# Altium schematic symbol library jlcpcb_2025_04_capacitors_extended_0805.schlib: 3281 symbols (part 2 of 18) (continued)
## 0805B331K201CT
designator C?  Capacitance: 330pF  (hidden comment: *)
Capacitor, Ceramic (MLCC), 330pF, ±10%, 200V, X7R, ±10%, SMD 0805; Manufacturer: Walsin Tech Corp; Manufacturer Part Number: 0805B331K201CT; Package Size: 0805; JLCPCB Basic Part: No; JLCPCB Part Number: C77467; Supplier 1: LCSC; Category: Capacitors - MLCC; Supplier Part Number 1: C77467; Tolerance: ±10%; Voltage Rating: 200V; Temperature Coefficient: X7R; RoHS: Yes; ComponentLink1Description: Datasheet; ComponentLink1URL: https://wmsc.lcsc.com/wmsc/upload/file/pdf/v2/lcsc/2304140030_Walsin-Tech-Corp-0805B331K201CT_C77467.pdf; ComponentLink2Description: JLCPCB Part URL; ComponentLink2URL: https://jlcpcb.com/partdetail/C77467; ComponentLink3Description: LCSC Part URL; ComponentLink3URL: https://lcsc.com/product-detail/Multilayer-Ceramic-Capacitors-MLCC---SMD-SMT_Walsin-Tech-Corp-Walsin-Tech-Corp-0805B331K201CT_C77467.html
footprint CAP-0805 (0805 (2012M) Capacitor)
pins: 1, 2

## 0805B331K201NT
designator C?  Capacitance: 330pF  (hidden comment: *)
Capacitor, Ceramic (MLCC), 330pF, ±10%, 200V, X7R, ±10%, SMD 0805; Manufacturer: FH (Guangdong Fenghua Advanced Tech); Manufacturer Part Number: 0805B331K201NT; Package Size: 0805; JLCPCB Basic Part: No; JLCPCB Part Number: C2991516; Supplier 1: LCSC; Category: Capacitors - MLCC; Supplier Part Number 1: C2991516; Tolerance: ±10%; Voltage Rating: 200V; Temperature Coefficient: X7R; RoHS: Yes; ComponentLink1Description: Datasheet; ComponentLink1URL: https://wmsc.lcsc.com/wmsc/upload/file/pdf/v2/lcsc/2204111630_FH--Guangdong-Fenghua-Advanced-Tech-0805B331K201NT_C2991516.pdf; ComponentLink2Description: JLCPCB Part URL; ComponentLink2URL: https://jlcpcb.com/partdetail/C2991516; ComponentLink3Description: LCSC Part URL; ComponentLink3URL: https://lcsc.com/product-detail/Multilayer-Ceramic-Capacitors-MLCC---SMD-SMT_FH-Guangdong-Fenghua-Advanced-Tech-FH-Guangdong-Fenghua-Advanced-Tech-0805B331K201NT_C2991516.html
footprint CAP-0805 (0805 (2012M) Capacitor)
pins: 1, 2

## 0805B331K251CT
designator C?  Capacitance: 330pF  (hidden comment: *)
Capacitor, Ceramic (MLCC), 330pF, ±10%, 250V, X7R, ±10%, SMD 0805; Manufacturer: Walsin Tech Corp; Manufacturer Part Number: 0805B331K251CT; Package Size: 0805; JLCPCB Basic Part: No; JLCPCB Part Number: C152985; Supplier 1: LCSC; Category: Capacitors - MLCC; Supplier Part Number 1: C152985; Tolerance: ±10%; Voltage Rating: 250V; Temperature Coefficient: X7R; RoHS: Yes; ComponentLink1Description: Datasheet; ComponentLink1URL: https://wmsc.lcsc.com/wmsc/upload/file/pdf/v2/lcsc/2304140030_Walsin-Tech-Corp-0805B331K251CT_C152985.pdf; ComponentLink2Description: JLCPCB Part URL; ComponentLink2URL: https://jlcpcb.com/partdetail/C152985; ComponentLink3Description: LCSC Part URL; ComponentLink3URL: https://lcsc.com/product-detail/Multilayer-Ceramic-Capacitors-MLCC---SMD-SMT_Walsin-Tech-Corp-Walsin-Tech-Corp-0805B331K251CT_C152985.html
footprint CAP-0805 (0805 (2012M) Capacitor)
pins: 1, 2

## 0805B331K251NT
designator C?  Capacitance: 330pF  (hidden comment: *)
Capacitor, Ceramic (MLCC), 330pF, 250V, X7R, SMD 0805; Manufacturer: FH-BK(Guangdong Fenghua Bangke Elec); Manufacturer Part Number: 0805B331K251NT; Package Size: 0805; JLCPCB Basic Part: No; JLCPCB Part Number: C2961013; Supplier 1: LCSC; Category: Capacitors - MLCC; Supplier Part Number 1: C2961013; Voltage Rating: 250V; Temperature Coefficient: X7R; RoHS: Yes; ComponentLink1Description: Datasheet; ComponentLink1URL: https://wmsc.lcsc.com/wmsc/upload/file/pdf/v2/lcsc/2201191030_FH-BK-Guangdong-Fenghua-Bangke-Elec-0805B331K251NT_C2961013.pdf; ComponentLink2Description: JLCPCB Part URL; ComponentLink2URL: https://jlcpcb.com/partdetail/C2961013; ComponentLink3Description: LCSC Part URL; ComponentLink3URL: https://lcsc.com/product-detail/Multilayer-Ceramic-Capacitors-MLCC---SMD-SMT_FH-BKGuangdong-Fenghua-Bangke-Elec-FH-BKGuangdong-Fenghua-Bangke-Elec-0805B331K251NT_C2961013.html
footprint CAP-0805 (0805 (2012M) Capacitor)
pins: 1, 2

## 0805B331K500CT
designator C?  Capacitance: 330pF  (hidden comment: *)
Capacitor, Ceramic (MLCC), 330pF, ±10%, 50V, X7R, ±10%, SMD 0805; Manufacturer: Walsin Tech Corp; Manufacturer Part Number: 0805B331K500CT; Package Size: 0805; JLCPCB Basic Part: No; JLCPCB Part Number: C123618; Supplier 1: LCSC; Category: Capacitors - MLCC; Supplier Part Number 1: C123618; Tolerance: ±10%; Voltage Rating: 50V; Temperature Coefficient: X7R; RoHS: Yes; ComponentLink1Description: Datasheet; ComponentLink1URL: https://wmsc.lcsc.com/wmsc/upload/file/pdf/v2/lcsc/2304140030_Walsin-Tech-Corp-0805B331K500CT_C123618.pdf; ComponentLink2Description: JLCPCB Part URL; ComponentLink2URL: https://jlcpcb.com/partdetail/C123618; ComponentLink3Description: LCSC Part URL; ComponentLink3URL: https://lcsc.com/product-detail/Multilayer-Ceramic-Capacitors-MLCC---SMD-SMT_Walsin-Tech-Corp-Walsin-Tech-Corp-0805B331K500CT_C123618.html
footprint CAP-0805 (0805 (2012M) Capacitor)
pins: 1, 2

## 0805B331K500NT
designator C?  Capacitance: 330pF  (hidden comment: *)
Capacitor, Ceramic (MLCC), 330pF, ±10%, 50V, X7R, ±10%, SMD 0805; Manufacturer: FH(Guangdong Fenghua Advanced Tech); Manufacturer Part Number: 0805B331K500NT; Package Size: 0805; JLCPCB Basic Part: No; JLCPCB Part Number: C1737; Supplier 1: LCSC; Category: Capacitors - MLCC; Supplier Part Number 1: C1737; Tolerance: ±10%; Voltage Rating: 50V; Temperature Coefficient: X7R; RoHS: Yes; ComponentLink1Description: Datasheet; ComponentLink1URL: https://wmsc.lcsc.com/wmsc/upload/file/pdf/v2/lcsc/2304140030_FH--Guangdong-Fenghua-Advanced-Tech-0805B331K500NT_C1737.pdf; ComponentLink2Description: JLCPCB Part URL; ComponentLink2URL: https://jlcpcb.com/partdetail/C1737; ComponentLink3Description: LCSC Part URL; ComponentLink3URL: https://lcsc.com/product-detail/Multilayer-Ceramic-Capacitors-MLCC---SMD-SMT_FH-Guangdong-Fenghua-Advanced-Tech-FH-Guangdong-Fenghua-Advanced-Tech-0805B331K500NT_C1737.html
footprint CAP-0805 (0805 (2012M) Capacitor)
pins: 1, 2

## 0805B331K501CT
designator C?  Capacitance: 330pF  (hidden comment: *)
Capacitor, Ceramic (MLCC), 330pF, ±10%, 500V, X7R, ±10%, SMD 0805; Manufacturer: Walsin Tech Corp; Manufacturer Part Number: 0805B331K501CT; Package Size: 0805; JLCPCB Basic Part: No; JLCPCB Part Number: C77468; Supplier 1: LCSC; Category: Capacitors - MLCC; Supplier Part Number 1: C77468; Tolerance: ±10%; Voltage Rating: 500V; Temperature Coefficient: X7R; RoHS: Yes; ComponentLink1Description: Datasheet; ComponentLink1URL: https://wmsc.lcsc.com/wmsc/upload/file/pdf/v2/lcsc/2304140030_Walsin-Tech-Corp-0805B331K501CT_C77468.pdf; ComponentLink2Description: JLCPCB Part URL; ComponentLink2URL: https://jlcpcb.com/partdetail/C77468; ComponentLink3Description: LCSC Part URL; ComponentLink3URL: https://lcsc.com/product-detail/Multilayer-Ceramic-Capacitors-MLCC---SMD-SMT_Walsin-Tech-Corp-Walsin-Tech-Corp-0805B331K501CT_C77468.html
footprint CAP-0805 (0805 (2012M) Capacitor)
pins: 1, 2

## 0805B332J500CT
designator C?  Capacitance: 3.3nF  (hidden comment: *)
Capacitor, Ceramic (MLCC), 3.3nF, ±5%, 50V, X7R, ±5%, SMD 0805; Manufacturer: Walsin Tech Corp; Manufacturer Part Number: 0805B332J500CT; Package Size: 0805; JLCPCB Basic Part: No; JLCPCB Part Number: C396725; Supplier 1: LCSC; Category: Capacitors - MLCC; Supplier Part Number 1: C396725; Tolerance: ±5%; Voltage Rating: 50V; Temperature Coefficient: X7R; RoHS: Yes; ComponentLink1Description: Datasheet; ComponentLink1URL: https://wmsc.lcsc.com/wmsc/upload/file/pdf/v2/lcsc/2304140030_Walsin-Tech-Corp-0805B332J500CT_C396725.pdf; ComponentLink2Description: JLCPCB Part URL; ComponentLink2URL: https://jlcpcb.com/partdetail/C396725; ComponentLink3Description: LCSC Part URL; ComponentLink3URL: https://lcsc.com/product-detail/Multilayer-Ceramic-Capacitors-MLCC---SMD-SMT_Walsin-Tech-Corp-Walsin-Tech-Corp-0805B332J500CT_C396725.html
footprint CAP-0805 (0805 (2012M) Capacitor)
pins: 1, 2

## 0805B332J500NT
designator C?  Capacitance: 3.3nF  (hidden comment: *)
Capacitor, Ceramic (MLCC), 3.3nF, ±5%, 50V, ±5%, SMD 0805; Manufacturer: FH(Guangdong Fenghua Advanced Tech); Manufacturer Part Number: 0805B332J500NT; Package Size: 0805; JLCPCB Basic Part: No; JLCPCB Part Number: C1322372; Supplier 1: LCSC; Category: Capacitors - MLCC; Supplier Part Number 1: C1322372; Tolerance: ±5%; Voltage Rating: 50V; RoHS: Yes; ComponentLink1Description: Datasheet; ComponentLink1URL: https://wmsc.lcsc.com/wmsc/upload/file/pdf/v2/lcsc/2304140030_FH--Guangdong-Fenghua-Advanced-Tech-0805B332J500NT_C1322372.pdf; ComponentLink2Description: JLCPCB Part URL; ComponentLink2URL: https://jlcpcb.com/partdetail/C1322372; ComponentLink3Description: LCSC Part URL; ComponentLink3URL: https://lcsc.com/product-detail/Multilayer-Ceramic-Capacitors-MLCC---SMD-SMT_FH-Guangdong-Fenghua-Advanced-Tech-FH-Guangdong-Fenghua-Advanced-Tech-0805B332J500NT_C1322372.html
footprint CAP-0805 (0805 (2012M) Capacitor)
pins: 1, 2

## 0805B332K101
designator C?  Capacitance: 3.3nF  (hidden comment: *)
Capacitor, Ceramic (MLCC), 3.3nF, ±10%, 100V, X7R, ±10%, SMD 0805; Manufacturer: Walsin Tech Corp; Manufacturer Part Number: 0805B332K101; Package Size: 0805; JLCPCB Basic Part: No; JLCPCB Part Number: C152984; Supplier 1: LCSC; Category: Capacitors - MLCC; Supplier Part Number 1: C152984; Tolerance: ±10%; Voltage Rating: 100V; Temperature Coefficient: X7R; RoHS: Yes; ComponentLink1Description: Datasheet; ComponentLink1URL: https://wmsc.lcsc.com/wmsc/upload/file/pdf/v2/lcsc/2304140030_Walsin-Tech-Corp-0805B332K101_C152984.pdf; ComponentLink2Description: JLCPCB Part URL; ComponentLink2URL: https://jlcpcb.com/partdetail/C152984; ComponentLink3Description: LCSC Part URL; ComponentLink3URL: https://lcsc.com/product-detail/Multilayer-Ceramic-Capacitors-MLCC---SMD-SMT_Walsin-Tech-Corp-Walsin-Tech-Corp-0805B332K101_C152984.html
footprint CAP-0805 (0805 (2012M) Capacitor)
pins: 1, 2

## 0805B332K251CT
designator C?  Capacitance: 3.3nF  (hidden comment: *)
Capacitor, Ceramic (MLCC), 3.3nF, ±10%, 250V, X7R, ±10%, SMD 0805; Manufacturer: Walsin Tech Corp; Manufacturer Part Number: 0805B332K251CT; Package Size: 0805; JLCPCB Basic Part: No; JLCPCB Part Number: C396726; Supplier 1: LCSC; Category: Capacitors - MLCC; Supplier Part Number 1: C396726; Tolerance: ±10%; Voltage Rating: 250V; Temperature Coefficient: X7R; RoHS: Yes; ComponentLink1Description: Datasheet; ComponentLink1URL: https://wmsc.lcsc.com/wmsc/upload/file/pdf/v2/lcsc/2304140030_Walsin-Tech-Corp-0805B332K251CT_C396726.pdf; ComponentLink2Description: JLCPCB Part URL; ComponentLink2URL: https://jlcpcb.com/partdetail/C396726; ComponentLink3Description: LCSC Part URL; ComponentLink3URL: https://lcsc.com/product-detail/Multilayer-Ceramic-Capacitors-MLCC---SMD-SMT_Walsin-Tech-Corp-Walsin-Tech-Corp-0805B332K251CT_C396726.html
footprint CAP-0805 (0805 (2012M) Capacitor)
pins: 1, 2

## 0805B332K500CT
designator C?  Capacitance: 3.3nF  (hidden comment: *)
Capacitor, Ceramic (MLCC), 3.3nF, ±10%, 50V, X7R, ±10%, SMD 0805; Manufacturer: Walsin Tech Corp; Manufacturer Part Number: 0805B332K500CT; Package Size: 0805; JLCPCB Basic Part: No; JLCPCB Part Number: C123619; Supplier 1: LCSC; Category: Capacitors - MLCC; Supplier Part Number 1: C123619; Tolerance: ±10%; Voltage Rating: 50V; Temperature Coefficient: X7R; RoHS: Yes; ComponentLink1Description: Datasheet; ComponentLink1URL: https://wmsc.lcsc.com/wmsc/upload/file/pdf/v2/lcsc/2304140030_Walsin-Tech-Corp-0805B332K500CT_C123619.pdf; ComponentLink2Description: JLCPCB Part URL; ComponentLink2URL: https://jlcpcb.com/partdetail/C123619; ComponentLink3Description: LCSC Part URL; ComponentLink3URL: https://lcsc.com/product-detail/Multilayer-Ceramic-Capacitors-MLCC---SMD-SMT_Walsin-Tech-Corp-Walsin-Tech-Corp-0805B332K500CT_C123619.html
footprint CAP-0805 (0805 (2012M) Capacitor)
pins: 1, 2

## 0805B332K500NT
designator C?  Capacitance: 3.3nF  (hidden comment: *)
Capacitor, Ceramic (MLCC), 3.3nF, ±10%, 50V, X7R, ±10%, SMD 0805; Manufacturer: FH(Guangdong Fenghua Advanced Tech); Manufacturer Part Number: 0805B332K500NT; Package Size: 0805; JLCPCB Basic Part: No; JLCPCB Part Number: C1738; Supplier 1: LCSC; Category: Capacitors - MLCC; Supplier Part Number 1: C1738; Tolerance: ±10%; Voltage Rating: 50V; Temperature Coefficient: X7R; RoHS: Yes; ComponentLink1Description: Datasheet; ComponentLink1URL: https://wmsc.lcsc.com/wmsc/upload/file/pdf/v2/lcsc/2304140030_FH--Guangdong-Fenghua-Advanced-Tech-0805B332K500NT_C1738.pdf; ComponentLink2Description: JLCPCB Part URL; ComponentLink2URL: https://jlcpcb.com/partdetail/C1738; ComponentLink3Description: LCSC Part URL; ComponentLink3URL: https://lcsc.com/product-detail/Multilayer-Ceramic-Capacitors-MLCC---SMD-SMT_FH-Guangdong-Fenghua-Advanced-Tech-FH-Guangdong-Fenghua-Advanced-Tech-0805B332K500NT_C1738.html
footprint CAP-0805 (0805 (2012M) Capacitor)
pins: 1, 2

## 0805B333J500
designator C?  Capacitance: 33nF  (hidden comment: *)
Capacitor, Ceramic (MLCC), 33nF, ±5%, 50V, X7R, ±5%, SMD 0805; Manufacturer: Walsin Tech Corp; Manufacturer Part Number: 0805B333J500; Package Size: 0805; JLCPCB Basic Part: No; JLCPCB Part Number: C152872; Supplier 1: LCSC; Category: Capacitors - MLCC; Supplier Part Number 1: C152872; Tolerance: ±5%; Voltage Rating: 50V; Temperature Coefficient: X7R; RoHS: Yes; ComponentLink1Description: Datasheet; ComponentLink1URL: https://wmsc.lcsc.com/wmsc/upload/file/pdf/v2/lcsc/2304140030_Walsin-Tech-Corp-0805B333J500_C152872.pdf; ComponentLink2Description: JLCPCB Part URL; ComponentLink2URL: https://jlcpcb.com/partdetail/C152872; ComponentLink3Description: LCSC Part URL; ComponentLink3URL: https://lcsc.com/product-detail/Multilayer-Ceramic-Capacitors-MLCC---SMD-SMT_Walsin-Tech-Corp-Walsin-Tech-Corp-0805B333J500_C152872.html
footprint CAP-0805 (0805 (2012M) Capacitor)
pins: 1, 2

## 0805B333J500NT
designator C?  Capacitance: 33nF  (hidden comment: *)
Capacitor, Ceramic (MLCC), 33nF, ±5%, 50V, X7R, ±5%, SMD 0805; Manufacturer: FH(Guangdong Fenghua Advanced Tech); Manufacturer Part Number: 0805B333J500NT; Package Size: 0805; JLCPCB Basic Part: No; JLCPCB Part Number: C880412; Supplier 1: LCSC; Category: Capacitors - MLCC; Supplier Part Number 1: C880412; Tolerance: ±5%; Voltage Rating: 50V; Temperature Coefficient: X7R; RoHS: Yes; ComponentLink1Description: Datasheet; ComponentLink1URL: https://wmsc.lcsc.com/wmsc/upload/file/pdf/v2/lcsc/2304140030_FH--Guangdong-Fenghua-Advanced-Tech-0805B333J500NT_C880412.pdf; ComponentLink2Description: JLCPCB Part URL; ComponentLink2URL: https://jlcpcb.com/partdetail/C880412; ComponentLink3Description: LCSC Part URL; ComponentLink3URL: https://lcsc.com/product-detail/Multilayer-Ceramic-Capacitors-MLCC---SMD-SMT_FH-Guangdong-Fenghua-Advanced-Tech-FH-Guangdong-Fenghua-Advanced-Tech-0805B333J500NT_C880412.html
footprint CAP-0805 (0805 (2012M) Capacitor)
pins: 1, 2

## 0805B333K101CT
designator C?  Capacitance: 33nF  (hidden comment: *)
Capacitor, Ceramic (MLCC), 33nF, ±10%, 100V, X7R, ±10%, SMD 0805; Manufacturer: Walsin Tech Corp; Manufacturer Part Number: 0805B333K101CT; Package Size: 0805; JLCPCB Basic Part: No; JLCPCB Part Number: C296077; Supplier 1: LCSC; Category: Capacitors - MLCC; Supplier Part Number 1: C296077; Tolerance: ±10%; Voltage Rating: 100V; Temperature Coefficient: X7R; RoHS: Yes; ComponentLink1Description: Datasheet; ComponentLink1URL: https://wmsc.lcsc.com/wmsc/upload/file/pdf/v2/lcsc/2304140030_Walsin-Tech-Corp-0805B333K101CT_C296077.pdf; ComponentLink2Description: JLCPCB Part URL; ComponentLink2URL: https://jlcpcb.com/partdetail/C296077; ComponentLink3Description: LCSC Part URL; ComponentLink3URL: https://lcsc.com/product-detail/Multilayer-Ceramic-Capacitors-MLCC---SMD-SMT_Walsin-Tech-Corp-Walsin-Tech-Corp-0805B333K101CT_C296077.html
footprint CAP-0805 (0805 (2012M) Capacitor)
pins: 1, 2

## 0805B333K251NT
designator C?  Capacitance: 33nF  (hidden comment: *)
Capacitor, Ceramic (MLCC), 33nF, ±10%, 250V, ±10%, SMD 0805; Manufacturer: FH(Guangdong Fenghua Advanced Tech); Manufacturer Part Number: 0805B333K251NT; Package Size: 0805; JLCPCB Basic Part: No; JLCPCB Part Number: C967579; Supplier 1: LCSC; Category: Capacitors - MLCC; Supplier Part Number 1: C967579; Tolerance: ±10%; Voltage Rating: 250V; RoHS: Yes; ComponentLink1Description: Datasheet; ComponentLink1URL: https://wmsc.lcsc.com/wmsc/upload/file/pdf/v2/lcsc/2304140030_FH--Guangdong-Fenghua-Advanced-Tech-0805B333K251NT_C967579.pdf; ComponentLink2Description: JLCPCB Part URL; ComponentLink2URL: https://jlcpcb.com/partdetail/C967579; ComponentLink3Description: LCSC Part URL; ComponentLink3URL: https://lcsc.com/product-detail/Multilayer-Ceramic-Capacitors-MLCC---SMD-SMT_FH-Guangdong-Fenghua-Advanced-Tech-FH-Guangdong-Fenghua-Advanced-Tech-0805B333K251NT_C967579.html
footprint CAP-0805 (0805 (2012M) Capacitor)
pins: 1, 2

## 0805B333K500CT
designator C?  Capacitance: 33nF  (hidden comment: *)
Capacitor, Ceramic (MLCC), 33nF, ±10%, 50V, X7R, ±10%, SMD 0805; Manufacturer: Walsin Tech Corp; Manufacturer Part Number: 0805B333K500CT; Package Size: 0805; JLCPCB Basic Part: No; JLCPCB Part Number: C340636; Supplier 1: LCSC; Category: Capacitors - MLCC; Supplier Part Number 1: C340636; Tolerance: ±10%; Voltage Rating: 50V; Temperature Coefficient: X7R; RoHS: Yes; ComponentLink1Description: Datasheet; ComponentLink1URL: https://wmsc.lcsc.com/wmsc/upload/file/pdf/v2/lcsc/2304140030_Walsin-Tech-Corp-0805B333K500CT_C340636.pdf; ComponentLink2Description: JLCPCB Part URL; ComponentLink2URL: https://jlcpcb.com/partdetail/C340636; ComponentLink3Description: LCSC Part URL; ComponentLink3URL: https://lcsc.com/product-detail/Multilayer-Ceramic-Capacitors-MLCC---SMD-SMT_Walsin-Tech-Corp-Walsin-Tech-Corp-0805B333K500CT_C340636.html
footprint CAP-0805 (0805 (2012M) Capacitor)
pins: 1, 2

## 0805B334K250CT
designator C?  Capacitance: 330nF  (hidden comment: *)
Capacitor, Ceramic (MLCC), 330nF, ±10%, 25V, X7R, ±10%, SMD 0805; Manufacturer: Walsin Tech Corp; Manufacturer Part Number: 0805B334K250CT; Package Size: 0805; JLCPCB Basic Part: No; JLCPCB Part Number: C384760; Supplier 1: LCSC; Category: Capacitors - MLCC; Supplier Part Number 1: C384760; Tolerance: ±10%; Voltage Rating: 25V; Temperature Coefficient: X7R; RoHS: Yes; ComponentLink1Description: Datasheet; ComponentLink1URL: https://wmsc.lcsc.com/wmsc/upload/file/pdf/v2/lcsc/2304140030_Walsin-Tech-Corp-0805B334K250CT_C384760.pdf; ComponentLink2Description: JLCPCB Part URL; ComponentLink2URL: https://jlcpcb.com/partdetail/C384760; ComponentLink3Description: LCSC Part URL; ComponentLink3URL: https://lcsc.com/product-detail/Multilayer-Ceramic-Capacitors-MLCC---SMD-SMT_Walsin-Tech-Corp-Walsin-Tech-Corp-0805B334K250CT_C384760.html
footprint CAP-0805 (0805 (2012M) Capacitor)
pins: 1, 2

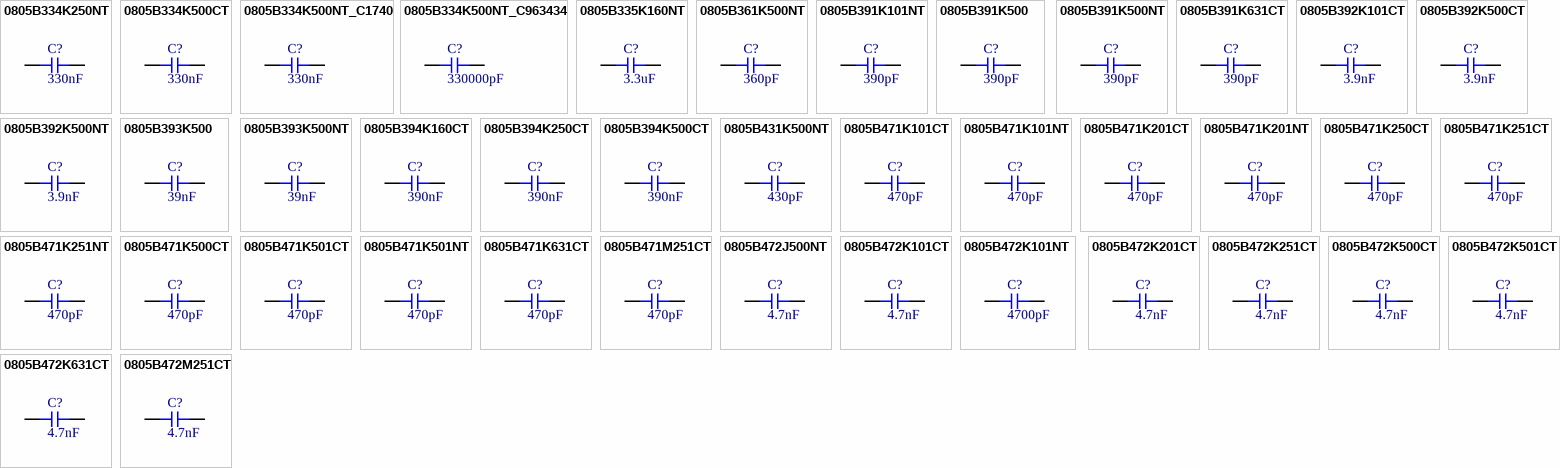
[diagram p6: symbols 0805B334K250NT to 0805B472M251CT]

## 0805B334K250NT
designator C?  Capacitance: 330nF  (hidden comment: *)
Capacitor, Ceramic (MLCC), 330nF, ±10%, 25V, X7R, ±10%, SMD 0805; Manufacturer: FH(Guangdong Fenghua Advanced Tech); Manufacturer Part Number: 0805B334K250NT; Package Size: 0805; JLCPCB Basic Part: No; JLCPCB Part Number: C336622; Supplier 1: LCSC; Category: Capacitors - MLCC; Supplier Part Number 1: C336622; Tolerance: ±10%; Voltage Rating: 25V; Temperature Coefficient: X7R; RoHS: Yes; ComponentLink1Description: Datasheet; ComponentLink1URL: https://wmsc.lcsc.com/wmsc/upload/file/pdf/v2/lcsc/2304140030_FH--Guangdong-Fenghua-Advanced-Tech-0805B334K250NT_C336622.pdf; ComponentLink2Description: JLCPCB Part URL; ComponentLink2URL: https://jlcpcb.com/partdetail/C336622; ComponentLink3Description: LCSC Part URL; ComponentLink3URL: https://lcsc.com/product-detail/Multilayer-Ceramic-Capacitors-MLCC---SMD-SMT_FH-Guangdong-Fenghua-Advanced-Tech-FH-Guangdong-Fenghua-Advanced-Tech-0805B334K250NT_C336622.html
footprint CAP-0805 (0805 (2012M) Capacitor)
pins: 1, 2

## 0805B334K500CT
designator C?  Capacitance: 330nF  (hidden comment: *)
Capacitor, Ceramic (MLCC), 330nF, ±10%, 50V, X7R, ±10%, SMD 0805; Manufacturer: Walsin Tech Corp; Manufacturer Part Number: 0805B334K500CT; Package Size: 0805; JLCPCB Basic Part: No; JLCPCB Part Number: C237212; Supplier 1: LCSC; Category: Capacitors - MLCC; Supplier Part Number 1: C237212; Tolerance: ±10%; Voltage Rating: 50V; Temperature Coefficient: X7R; RoHS: Yes; ComponentLink1Description: Datasheet; ComponentLink1URL: https://wmsc.lcsc.com/wmsc/upload/file/pdf/v2/lcsc/2304140030_Walsin-Tech-Corp-0805B334K500CT_C237212.pdf; ComponentLink2Description: JLCPCB Part URL; ComponentLink2URL: https://jlcpcb.com/partdetail/C237212; ComponentLink3Description: LCSC Part URL; ComponentLink3URL: https://lcsc.com/product-detail/Multilayer-Ceramic-Capacitors-MLCC---SMD-SMT_Walsin-Tech-Corp-Walsin-Tech-Corp-0805B334K500CT_C237212.html
footprint CAP-0805 (0805 (2012M) Capacitor)
pins: 1, 2

## 0805B334K500NT_C1740
designator C?  Capacitance: 330nF  (hidden comment: *)
Capacitor, Ceramic (MLCC), 330nF, ±10%, 50V, X7R, ±10%, SMD 0805; Manufacturer: FH(Guangdong Fenghua Advanced Tech); Manufacturer Part Number: 0805B334K500NT; Package Size: 0805; JLCPCB Basic Part: No; JLCPCB Part Number: C1740; Supplier 1: LCSC; Category: Capacitors - MLCC; Supplier Part Number 1: C1740; Tolerance: ±10%; Voltage Rating: 50V; Temperature Coefficient: X7R; RoHS: Yes; ComponentLink1Description: Datasheet; ComponentLink1URL: https://wmsc.lcsc.com/wmsc/upload/file/pdf/v2/lcsc/2304140030_FH--Guangdong-Fenghua-Advanced-Tech-0805B334K500NT_C1740.pdf; ComponentLink2Description: JLCPCB Part URL; ComponentLink2URL: https://jlcpcb.com/partdetail/C1740; ComponentLink3Description: LCSC Part URL; ComponentLink3URL: https://lcsc.com/product-detail/Multilayer-Ceramic-Capacitors-MLCC---SMD-SMT_FH-Guangdong-Fenghua-Advanced-Tech-FH-Guangdong-Fenghua-Advanced-Tech-0805B334K500NT_C1740.html
footprint CAP-0805 (0805 (2012M) Capacitor)
pins: 1, 2

## 0805B334K500NT_C963434
designator C?  Capacitance: 330000pF  (hidden comment: *)
Capacitor, Ceramic (MLCC), 330000pF, ±10%, 50V, X7R, ±10%, SMD 0805; Manufacturer: FH (Guangdong Fenghua Advanced Tech); Manufacturer Part Number: 0805B334K500NT; Package Size: 0805; JLCPCB Basic Part: No; JLCPCB Part Number: C963434; Supplier 1: LCSC; Category: Capacitors - MLCC; Supplier Part Number 1: C963434; Tolerance: ±10%; Voltage Rating: 50V; Temperature Coefficient: X7R; RoHS: Yes; ComponentLink1Description: Datasheet; ComponentLink1URL: https://wmsc.lcsc.com/wmsc/upload/file/pdf/v2/lcsc/2011271809_FH--Guangdong-Fenghua-Advanced-Tech-0805B334K500NT_C963434.pdf; ComponentLink2Description: JLCPCB Part URL; ComponentLink2URL: https://jlcpcb.com/partdetail/C963434; ComponentLink3Description: LCSC Part URL; ComponentLink3URL: https://lcsc.com/product-detail/Multilayer-Ceramic-Capacitors-MLCC---SMD-SMT_FH-Guangdong-Fenghua-Advanced-Tech-FH-Guangdong-Fenghua-Advanced-Tech-0805B334K500NT_C963434.html
footprint CAP-0805 (0805 (2012M) Capacitor)
pins: 1, 2

## 0805B335K160NT
designator C?  Capacitance: 3.3uF  (hidden comment: *)
Capacitor, Ceramic (MLCC), 3.3uF, ±10%, 16V, X7R, ±10%, SMD 0805; Manufacturer: FH(Guangdong Fenghua Advanced Tech); Manufacturer Part Number: 0805B335K160NT; Package Size: 0805; JLCPCB Basic Part: No; JLCPCB Part Number: C38332; Supplier 1: LCSC; Category: Capacitors - MLCC; Supplier Part Number 1: C38332; Tolerance: ±10%; Voltage Rating: 16V; Temperature Coefficient: X7R; RoHS: Yes; ComponentLink1Description: Datasheet; ComponentLink1URL: https://wmsc.lcsc.com/wmsc/upload/file/pdf/v2/lcsc/2304140030_FH--Guangdong-Fenghua-Advanced-Tech-0805B335K160NT_C38332.pdf; ComponentLink2Description: JLCPCB Part URL; ComponentLink2URL: https://jlcpcb.com/partdetail/C38332; ComponentLink3Description: LCSC Part URL; ComponentLink3URL: https://lcsc.com/product-detail/Multilayer-Ceramic-Capacitors-MLCC---SMD-SMT_FH-Guangdong-Fenghua-Advanced-Tech-FH-Guangdong-Fenghua-Advanced-Tech-0805B335K160NT_C38332.html
footprint CAP-0805 (0805 (2012M) Capacitor)
pins: 1, 2

## 0805B361K500NT
designator C?  Capacitance: 360pF  (hidden comment: *)
Capacitor, Ceramic (MLCC), 360pF, ±10%, 50V, X7R, ±10%, SMD 0805; Manufacturer: FH(Guangdong Fenghua Advanced Tech); Manufacturer Part Number: 0805B361K500NT; Package Size: 0805; JLCPCB Basic Part: No; JLCPCB Part Number: C28167; Supplier 1: LCSC; Category: Capacitors - MLCC; Supplier Part Number 1: C28167; Tolerance: ±10%; Voltage Rating: 50V; Temperature Coefficient: X7R; RoHS: Yes; ComponentLink1Description: Datasheet; ComponentLink1URL: https://wmsc.lcsc.com/wmsc/upload/file/pdf/v2/lcsc/2304140030_FH--Guangdong-Fenghua-Advanced-Tech-0805B361K500NT_C28167.pdf; ComponentLink2Description: JLCPCB Part URL; ComponentLink2URL: https://jlcpcb.com/partdetail/C28167; ComponentLink3Description: LCSC Part URL; ComponentLink3URL: https://lcsc.com/product-detail/Multilayer-Ceramic-Capacitors-MLCC---SMD-SMT_FH-Guangdong-Fenghua-Advanced-Tech-FH-Guangdong-Fenghua-Advanced-Tech-0805B361K500NT_C28167.html
footprint CAP-0805 (0805 (2012M) Capacitor)
pins: 1, 2

## 0805B391K101NT
designator C?  Capacitance: 390pF  (hidden comment: *)
Capacitor, Ceramic (MLCC), 390pF, ±10%, 100V, X7R, ±10%, SMD 0805; Manufacturer: FH(Guangdong Fenghua Advanced Tech); Manufacturer Part Number: 0805B391K101NT; Package Size: 0805; JLCPCB Basic Part: No; JLCPCB Part Number: C76468; Supplier 1: LCSC; Category: Capacitors - MLCC; Supplier Part Number 1: C76468; Tolerance: ±10%; Voltage Rating: 100V; Temperature Coefficient: X7R; RoHS: Yes; ComponentLink1Description: Datasheet; ComponentLink1URL: https://wmsc.lcsc.com/wmsc/upload/file/pdf/v2/lcsc/2304140030_FH--Guangdong-Fenghua-Advanced-Tech-0805B391K101NT_C76468.pdf; ComponentLink2Description: JLCPCB Part URL; ComponentLink2URL: https://jlcpcb.com/partdetail/C76468; ComponentLink3Description: LCSC Part URL; ComponentLink3URL: https://lcsc.com/product-detail/Multilayer-Ceramic-Capacitors-MLCC---SMD-SMT_FH-Guangdong-Fenghua-Advanced-Tech-FH-Guangdong-Fenghua-Advanced-Tech-0805B391K101NT_C76468.html
footprint CAP-0805 (0805 (2012M) Capacitor)
pins: 1, 2

## 0805B391K500
designator C?  Capacitance: 390pF  (hidden comment: *)
Capacitor, Ceramic (MLCC), 390pF, ±10%, 50V, X7R, ±10%, SMD 0805; Manufacturer: Walsin Tech Corp; Manufacturer Part Number: 0805B391K500; Package Size: 0805; JLCPCB Basic Part: No; JLCPCB Part Number: C152871; Supplier 1: LCSC; Category: Capacitors - MLCC; Supplier Part Number 1: C152871; Tolerance: ±10%; Voltage Rating: 50V; Temperature Coefficient: X7R; RoHS: Yes; ComponentLink1Description: Datasheet; ComponentLink1URL: https://wmsc.lcsc.com/wmsc/upload/file/pdf/v2/lcsc/2304140030_Walsin-Tech-Corp-0805B391K500_C152871.pdf; ComponentLink2Description: JLCPCB Part URL; ComponentLink2URL: https://jlcpcb.com/partdetail/C152871; ComponentLink3Description: LCSC Part URL; ComponentLink3URL: https://lcsc.com/product-detail/Multilayer-Ceramic-Capacitors-MLCC---SMD-SMT_Walsin-Tech-Corp-Walsin-Tech-Corp-0805B391K500_C152871.html
footprint CAP-0805 (0805 (2012M) Capacitor)
pins: 1, 2

## 0805B391K500NT
designator C?  Capacitance: 390pF  (hidden comment: *)
Capacitor, Ceramic (MLCC), 390pF, ±10%, 50V, X7R, ±10%, SMD 0805; Manufacturer: FH(Guangdong Fenghua Advanced Tech); Manufacturer Part Number: 0805B391K500NT; Package Size: 0805; JLCPCB Basic Part: No; JLCPCB Part Number: C1741; Supplier 1: LCSC; Category: Capacitors - MLCC; Supplier Part Number 1: C1741; Tolerance: ±10%; Voltage Rating: 50V; Temperature Coefficient: X7R; RoHS: Yes; ComponentLink1Description: Datasheet; ComponentLink1URL: https://wmsc.lcsc.com/wmsc/upload/file/pdf/v2/lcsc/2304140030_FH--Guangdong-Fenghua-Advanced-Tech-0805B391K500NT_C1741.pdf; ComponentLink2Description: JLCPCB Part URL; ComponentLink2URL: https://jlcpcb.com/partdetail/C1741; ComponentLink3Description: LCSC Part URL; ComponentLink3URL: https://lcsc.com/product-detail/Multilayer-Ceramic-Capacitors-MLCC---SMD-SMT_FH-Guangdong-Fenghua-Advanced-Tech-FH-Guangdong-Fenghua-Advanced-Tech-0805B391K500NT_C1741.html
footprint CAP-0805 (0805 (2012M) Capacitor)
pins: 1, 2

## 0805B391K631CT
designator C?  Capacitance: 390pF  (hidden comment: *)
Capacitor, Ceramic (MLCC), 390pF, ±10%, 630V, X7R, ±10%, SMD 0805; Manufacturer: Walsin Tech Corp; Manufacturer Part Number: 0805B391K631CT; Package Size: 0805; JLCPCB Basic Part: No; JLCPCB Part Number: C303908; Supplier 1: LCSC; Category: Capacitors - MLCC; Supplier Part Number 1: C303908; Tolerance: ±10%; Voltage Rating: 630V; Temperature Coefficient: X7R; RoHS: Yes; ComponentLink1Description: Datasheet; ComponentLink2Description: JLCPCB Part URL; ComponentLink2URL: https://jlcpcb.com/partdetail/C303908; ComponentLink3Description: LCSC Part URL; ComponentLink3URL: https://lcsc.com/product-detail/Multilayer-Ceramic-Capacitors-MLCC---SMD-SMT_Walsin-Tech-Corp-Walsin-Tech-Corp-0805B391K631CT_C303908.html
footprint CAP-0805 (0805 (2012M) Capacitor)
pins: 1, 2

## 0805B392K101CT
designator C?  Capacitance: 3.9nF  (hidden comment: *)
Capacitor, Ceramic (MLCC), 3.9nF, ±10%, 100V, X7R, ±10%, SMD 0805; Manufacturer: Walsin Tech Corp; Manufacturer Part Number: 0805B392K101CT; Package Size: 0805; JLCPCB Basic Part: No; JLCPCB Part Number: C384759; Supplier 1: LCSC; Category: Capacitors - MLCC; Supplier Part Number 1: C384759; Tolerance: ±10%; Voltage Rating: 100V; Temperature Coefficient: X7R; RoHS: Yes; ComponentLink1Description: Datasheet; ComponentLink1URL: https://wmsc.lcsc.com/wmsc/upload/file/pdf/v2/lcsc/2304140030_Walsin-Tech-Corp-0805B392K101CT_C384759.pdf; ComponentLink2Description: JLCPCB Part URL; ComponentLink2URL: https://jlcpcb.com/partdetail/C384759; ComponentLink3Description: LCSC Part URL; ComponentLink3URL: https://lcsc.com/product-detail/Multilayer-Ceramic-Capacitors-MLCC---SMD-SMT_Walsin-Tech-Corp-Walsin-Tech-Corp-0805B392K101CT_C384759.html
footprint CAP-0805 (0805 (2012M) Capacitor)
pins: 1, 2

## 0805B392K500CT
designator C?  Capacitance: 3.9nF  (hidden comment: *)
Capacitor, Ceramic (MLCC), 3.9nF, ±10%, 50V, X7R, ±10%, SMD 0805; Manufacturer: Walsin Tech Corp; Manufacturer Part Number: 0805B392K500CT; Package Size: 0805; JLCPCB Basic Part: No; JLCPCB Part Number: C525502; Supplier 1: LCSC; Category: Capacitors - MLCC; Supplier Part Number 1: C525502; Tolerance: ±10%; Voltage Rating: 50V; Temperature Coefficient: X7R; RoHS: Yes; ComponentLink1Description: Datasheet; ComponentLink1URL: https://wmsc.lcsc.com/wmsc/upload/file/pdf/v2/lcsc/2304140030_Walsin-Tech-Corp-0805B392K500CT_C525502.pdf; ComponentLink2Description: JLCPCB Part URL; ComponentLink2URL: https://jlcpcb.com/partdetail/C525502; ComponentLink3Description: LCSC Part URL; ComponentLink3URL: https://lcsc.com/product-detail/Multilayer-Ceramic-Capacitors-MLCC---SMD-SMT_Walsin-Tech-Corp-Walsin-Tech-Corp-0805B392K500CT_C525502.html
footprint CAP-0805 (0805 (2012M) Capacitor)
pins: 1, 2

## 0805B392K500NT
designator C?  Capacitance: 3.9nF  (hidden comment: *)
Capacitor, Ceramic (MLCC), 3.9nF, ±10%, 50V, X7R, ±10%, SMD 0805; Manufacturer: FH(Guangdong Fenghua Advanced Tech); Manufacturer Part Number: 0805B392K500NT; Package Size: 0805; JLCPCB Basic Part: No; JLCPCB Part Number: C1742; Supplier 1: LCSC; Category: Capacitors - MLCC; Supplier Part Number 1: C1742; Tolerance: ±10%; Voltage Rating: 50V; Temperature Coefficient: X7R; RoHS: Yes; ComponentLink1Description: Datasheet; ComponentLink1URL: https://wmsc.lcsc.com/wmsc/upload/file/pdf/v2/lcsc/2304140030_FH--Guangdong-Fenghua-Advanced-Tech-0805B392K500NT_C1742.pdf; ComponentLink2Description: JLCPCB Part URL; ComponentLink2URL: https://jlcpcb.com/partdetail/C1742; ComponentLink3Description: LCSC Part URL; ComponentLink3URL: https://lcsc.com/product-detail/Multilayer-Ceramic-Capacitors-MLCC---SMD-SMT_FH-Guangdong-Fenghua-Advanced-Tech-FH-Guangdong-Fenghua-Advanced-Tech-0805B392K500NT_C1742.html
footprint CAP-0805 (0805 (2012M) Capacitor)
pins: 1, 2

## 0805B393K500
designator C?  Capacitance: 39nF  (hidden comment: *)
Capacitor, Ceramic (MLCC), 39nF, ±10%, 50V, X7R, ±10%, SMD 0805; Manufacturer: Walsin Tech Corp; Manufacturer Part Number: 0805B393K500; Package Size: 0805; JLCPCB Basic Part: No; JLCPCB Part Number: C152870; Supplier 1: LCSC; Category: Capacitors - MLCC; Supplier Part Number 1: C152870; Tolerance: ±10%; Voltage Rating: 50V; Temperature Coefficient: X7R; RoHS: Yes; ComponentLink1Description: Datasheet; ComponentLink1URL: https://wmsc.lcsc.com/wmsc/upload/file/pdf/v2/lcsc/2304140030_Walsin-Tech-Corp-0805B393K500_C152870.pdf; ComponentLink2Description: JLCPCB Part URL; ComponentLink2URL: https://jlcpcb.com/partdetail/C152870; ComponentLink3Description: LCSC Part URL; ComponentLink3URL: https://lcsc.com/product-detail/Multilayer-Ceramic-Capacitors-MLCC---SMD-SMT_Walsin-Tech-Corp-Walsin-Tech-Corp-0805B393K500_C152870.html
footprint CAP-0805 (0805 (2012M) Capacitor)
pins: 1, 2

## 0805B393K500NT
designator C?  Capacitance: 39nF  (hidden comment: *)
Capacitor, Ceramic (MLCC), 39nF, ±10%, 50V, X7R, ±10%, SMD 0805; Manufacturer: FH(Guangdong Fenghua Advanced Tech); Manufacturer Part Number: 0805B393K500NT; Package Size: 0805; JLCPCB Basic Part: No; JLCPCB Part Number: C39760; Supplier 1: LCSC; Category: Capacitors - MLCC; Supplier Part Number 1: C39760; Tolerance: ±10%; Voltage Rating: 50V; Temperature Coefficient: X7R; RoHS: Yes; ComponentLink1Description: Datasheet; ComponentLink1URL: https://wmsc.lcsc.com/wmsc/upload/file/pdf/v2/lcsc/2304140030_FH--Guangdong-Fenghua-Advanced-Tech-0805B393K500NT_C39760.pdf; ComponentLink2Description: JLCPCB Part URL; ComponentLink2URL: https://jlcpcb.com/partdetail/C39760; ComponentLink3Description: LCSC Part URL; ComponentLink3URL: https://lcsc.com/product-detail/Multilayer-Ceramic-Capacitors-MLCC---SMD-SMT_FH-Guangdong-Fenghua-Advanced-Tech-FH-Guangdong-Fenghua-Advanced-Tech-0805B393K500NT_C39760.html
footprint CAP-0805 (0805 (2012M) Capacitor)
pins: 1, 2

## 0805B394K160CT
designator C?  Capacitance: 390nF  (hidden comment: *)
Capacitor, Ceramic (MLCC), 390nF, ±10%, 16V, X7R, ±10%, SMD 0805; Manufacturer: Walsin Tech Corp; Manufacturer Part Number: 0805B394K160CT; Package Size: 0805; JLCPCB Basic Part: No; JLCPCB Part Number: C152869; Supplier 1: LCSC; Category: Capacitors - MLCC; Supplier Part Number 1: C152869; Tolerance: ±10%; Voltage Rating: 16V; Temperature Coefficient: X7R; RoHS: Yes; ComponentLink1Description: Datasheet; ComponentLink1URL: https://wmsc.lcsc.com/wmsc/upload/file/pdf/v2/lcsc/2304140030_Walsin-Tech-Corp-0805B394K160CT_C152869.pdf; ComponentLink2Description: JLCPCB Part URL; ComponentLink2URL: https://jlcpcb.com/partdetail/C152869; ComponentLink3Description: LCSC Part URL; ComponentLink3URL: https://lcsc.com/product-detail/Multilayer-Ceramic-Capacitors-MLCC---SMD-SMT_Walsin-Tech-Corp-Walsin-Tech-Corp-0805B394K160CT_C152869.html
footprint CAP-0805 (0805 (2012M) Capacitor)
pins: 1, 2

## 0805B394K250CT
designator C?  Capacitance: 390nF  (hidden comment: *)
Capacitor, Ceramic (MLCC), 390nF, ±10%, 25V, X7R, ±10%, SMD 0805; Manufacturer: Walsin Tech Corp; Manufacturer Part Number: 0805B394K250CT; Package Size: 0805; JLCPCB Basic Part: No; JLCPCB Part Number: C384758; Supplier 1: LCSC; Category: Capacitors - MLCC; Supplier Part Number 1: C384758; Tolerance: ±10%; Voltage Rating: 25V; Temperature Coefficient: X7R; RoHS: Yes; ComponentLink1Description: Datasheet; ComponentLink1URL: https://wmsc.lcsc.com/wmsc/upload/file/pdf/v2/lcsc/2304140030_Walsin-Tech-Corp-0805B394K250CT_C384758.pdf; ComponentLink2Description: JLCPCB Part URL; ComponentLink2URL: https://jlcpcb.com/partdetail/C384758; ComponentLink3Description: LCSC Part URL; ComponentLink3URL: https://lcsc.com/product-detail/Multilayer-Ceramic-Capacitors-MLCC---SMD-SMT_Walsin-Tech-Corp-Walsin-Tech-Corp-0805B394K250CT_C384758.html
footprint CAP-0805 (0805 (2012M) Capacitor)
pins: 1, 2

## 0805B394K500CT
designator C?  Capacitance: 390nF  (hidden comment: *)
Capacitor, Ceramic (MLCC), 390nF, ±10%, 50V, X7R, ±10%, SMD 0805; Manufacturer: Walsin Tech Corp; Manufacturer Part Number: 0805B394K500CT; Package Size: 0805; JLCPCB Basic Part: No; JLCPCB Part Number: C384757; Supplier 1: LCSC; Category: Capacitors - MLCC; Supplier Part Number 1: C384757; Tolerance: ±10%; Voltage Rating: 50V; Temperature Coefficient: X7R; RoHS: Yes; ComponentLink1Description: Datasheet; ComponentLink1URL: https://wmsc.lcsc.com/wmsc/upload/file/pdf/v2/lcsc/2304140030_Walsin-Tech-Corp-0805B394K500CT_C384757.pdf; ComponentLink2Description: JLCPCB Part URL; ComponentLink2URL: https://jlcpcb.com/partdetail/C384757; ComponentLink3Description: LCSC Part URL; ComponentLink3URL: https://lcsc.com/product-detail/Multilayer-Ceramic-Capacitors-MLCC---SMD-SMT_Walsin-Tech-Corp-Walsin-Tech-Corp-0805B394K500CT_C384757.html
footprint CAP-0805 (0805 (2012M) Capacitor)
pins: 1, 2

## 0805B431K500NT
designator C?  Capacitance: 430pF  (hidden comment: *)
Capacitor, Ceramic (MLCC), 430pF, ±10%, 50V, X7R, ±10%, SMD 0805; Manufacturer: FH(Guangdong Fenghua Advanced Tech); Manufacturer Part Number: 0805B431K500NT; Package Size: 0805; JLCPCB Basic Part: No; JLCPCB Part Number: C67898; Supplier 1: LCSC; Category: Capacitors - MLCC; Supplier Part Number 1: C67898; Tolerance: ±10%; Voltage Rating: 50V; Temperature Coefficient: X7R; RoHS: Yes; ComponentLink1Description: Datasheet; ComponentLink1URL: https://wmsc.lcsc.com/wmsc/upload/file/pdf/v2/lcsc/2304140030_FH--Guangdong-Fenghua-Advanced-Tech-0805B431K500NT_C67898.pdf; ComponentLink2Description: JLCPCB Part URL; ComponentLink2URL: https://jlcpcb.com/partdetail/C67898; ComponentLink3Description: LCSC Part URL; ComponentLink3URL: https://lcsc.com/product-detail/Multilayer-Ceramic-Capacitors-MLCC---SMD-SMT_FH-Guangdong-Fenghua-Advanced-Tech-FH-Guangdong-Fenghua-Advanced-Tech-0805B431K500NT_C67898.html
footprint CAP-0805 (0805 (2012M) Capacitor)
pins: 1, 2

## 0805B471K101CT
designator C?  Capacitance: 470pF  (hidden comment: *)
Capacitor, Ceramic (MLCC), 470pF, ±10%, 100V, X7R, ±10%, SMD 0805; Manufacturer: Walsin Tech Corp; Manufacturer Part Number: 0805B471K101CT; Package Size: 0805; JLCPCB Basic Part: No; JLCPCB Part Number: C77469; Supplier 1: LCSC; Category: Capacitors - MLCC; Supplier Part Number 1: C77469; Tolerance: ±10%; Voltage Rating: 100V; Temperature Coefficient: X7R; RoHS: Yes; ComponentLink1Description: Datasheet; ComponentLink1URL: https://wmsc.lcsc.com/wmsc/upload/file/pdf/v2/lcsc/2304140030_Walsin-Tech-Corp-0805B471K101CT_C77469.pdf; ComponentLink2Description: JLCPCB Part URL; ComponentLink2URL: https://jlcpcb.com/partdetail/C77469; ComponentLink3Description: LCSC Part URL; ComponentLink3URL: https://lcsc.com/product-detail/Multilayer-Ceramic-Capacitors-MLCC---SMD-SMT_Walsin-Tech-Corp-Walsin-Tech-Corp-0805B471K101CT_C77469.html
footprint CAP-0805 (0805 (2012M) Capacitor)
pins: 1, 2

## 0805B471K101NT
designator C?  Capacitance: 470pF  (hidden comment: *)
Capacitor, Ceramic (MLCC), 470pF, ±10%, 100V, X7R, ±10%, SMD 0805; Manufacturer: FH(Guangdong Fenghua Advanced Tech); Manufacturer Part Number: 0805B471K101NT; Package Size: 0805; JLCPCB Basic Part: No; JLCPCB Part Number: C313090; Supplier 1: LCSC; Category: Capacitors - MLCC; Supplier Part Number 1: C313090; Tolerance: ±10%; Voltage Rating: 100V; Temperature Coefficient: X7R; RoHS: Yes; ComponentLink1Description: Datasheet; ComponentLink1URL: https://wmsc.lcsc.com/wmsc/upload/file/pdf/v2/lcsc/2304140030_FH--Guangdong-Fenghua-Advanced-Tech-0805B471K101NT_C313090.pdf; ComponentLink2Description: JLCPCB Part URL; ComponentLink2URL: https://jlcpcb.com/partdetail/C313090; ComponentLink3Description: LCSC Part URL; ComponentLink3URL: https://lcsc.com/product-detail/Multilayer-Ceramic-Capacitors-MLCC---SMD-SMT_FH-Guangdong-Fenghua-Advanced-Tech-FH-Guangdong-Fenghua-Advanced-Tech-0805B471K101NT_C313090.html
footprint CAP-0805 (0805 (2012M) Capacitor)
pins: 1, 2

## 0805B471K201CT
designator C?  Capacitance: 470pF  (hidden comment: *)
Capacitor, Ceramic (MLCC), 470pF, ±10%, 200V, X7R, ±10%, SMD 0805; Manufacturer: Walsin Tech Corp; Manufacturer Part Number: 0805B471K201CT; Package Size: 0805; JLCPCB Basic Part: No; JLCPCB Part Number: C396728; Supplier 1: LCSC; Category: Capacitors - MLCC; Supplier Part Number 1: C396728; Tolerance: ±10%; Voltage Rating: 200V; Temperature Coefficient: X7R; RoHS: Yes; ComponentLink1Description: Datasheet; ComponentLink1URL: https://wmsc.lcsc.com/wmsc/upload/file/pdf/v2/lcsc/2304140030_Walsin-Tech-Corp-0805B471K201CT_C396728.pdf; ComponentLink2Description: JLCPCB Part URL; ComponentLink2URL: https://jlcpcb.com/partdetail/C396728; ComponentLink3Description: LCSC Part URL; ComponentLink3URL: https://lcsc.com/product-detail/Multilayer-Ceramic-Capacitors-MLCC---SMD-SMT_Walsin-Tech-Corp-Walsin-Tech-Corp-0805B471K201CT_C396728.html
footprint CAP-0805 (0805 (2012M) Capacitor)
pins: 1, 2

## 0805B471K201NT
designator C?  Capacitance: 470pF  (hidden comment: *)
Capacitor, Ceramic (MLCC), 470pF, ±10%, 200V, X7R, ±10%, SMD 0805; Manufacturer: FH(Guangdong Fenghua Advanced Tech); Manufacturer Part Number: 0805B471K201NT; Package Size: 0805; JLCPCB Basic Part: No; JLCPCB Part Number: C574052; Supplier 1: LCSC; Category: Capacitors - MLCC; Supplier Part Number 1: C574052; Tolerance: ±10%; Voltage Rating: 200V; Temperature Coefficient: X7R; RoHS: Yes; ComponentLink1Description: Datasheet; ComponentLink1URL: https://wmsc.lcsc.com/wmsc/upload/file/pdf/v2/lcsc/2304140030_FH--Guangdong-Fenghua-Advanced-Tech-0805B471K201NT_C574052.pdf; ComponentLink2Description: JLCPCB Part URL; ComponentLink2URL: https://jlcpcb.com/partdetail/C574052; ComponentLink3Description: LCSC Part URL; ComponentLink3URL: https://lcsc.com/product-detail/Multilayer-Ceramic-Capacitors-MLCC---SMD-SMT_FH-Guangdong-Fenghua-Advanced-Tech-FH-Guangdong-Fenghua-Advanced-Tech-0805B471K201NT_C574052.html
footprint CAP-0805 (0805 (2012M) Capacitor)
pins: 1, 2

## 0805B471K250CT
designator C?  Capacitance: 470pF  (hidden comment: *)
Capacitor, Ceramic (MLCC), 470pF, ±10%, 25V, X7R, ±10%, SMD 0805; Manufacturer: Walsin Tech Corp; Manufacturer Part Number: 0805B471K250CT; Package Size: 0805; JLCPCB Basic Part: No; JLCPCB Part Number: C424845; Supplier 1: LCSC; Category: Capacitors - MLCC; Supplier Part Number 1: C424845; Tolerance: ±10%; Voltage Rating: 25V; Temperature Coefficient: X7R; RoHS: Yes; ComponentLink1Description: Datasheet; ComponentLink1URL: https://wmsc.lcsc.com/wmsc/upload/file/pdf/v2/lcsc/2304140030_Walsin-Tech-Corp-0805B471K250CT_C424845.pdf; ComponentLink2Description: JLCPCB Part URL; ComponentLink2URL: https://jlcpcb.com/partdetail/C424845; ComponentLink3Description: LCSC Part URL; ComponentLink3URL: https://lcsc.com/product-detail/Multilayer-Ceramic-Capacitors-MLCC---SMD-SMT_Walsin-Tech-Corp-Walsin-Tech-Corp-0805B471K250CT_C424845.html
footprint CAP-0805 (0805 (2012M) Capacitor)
pins: 1, 2

## 0805B471K251CT
designator C?  Capacitance: 470pF  (hidden comment: *)
Capacitor, Ceramic (MLCC), 470pF, ±10%, 250V, X7R, ±10%, SMD 0805; Manufacturer: Walsin Tech Corp; Manufacturer Part Number: 0805B471K251CT; Package Size: 0805; JLCPCB Basic Part: No; JLCPCB Part Number: C77471; Supplier 1: LCSC; Category: Capacitors - MLCC; Supplier Part Number 1: C77471; Tolerance: ±10%; Voltage Rating: 250V; Temperature Coefficient: X7R; RoHS: Yes; ComponentLink1Description: Datasheet; ComponentLink1URL: https://wmsc.lcsc.com/wmsc/upload/file/pdf/v2/lcsc/2304140030_Walsin-Tech-Corp-0805B471K251CT_C77471.pdf; ComponentLink2Description: JLCPCB Part URL; ComponentLink2URL: https://jlcpcb.com/partdetail/C77471; ComponentLink3Description: LCSC Part URL; ComponentLink3URL: https://lcsc.com/product-detail/Multilayer-Ceramic-Capacitors-MLCC---SMD-SMT_Walsin-Tech-Corp-Walsin-Tech-Corp-0805B471K251CT_C77471.html
footprint CAP-0805 (0805 (2012M) Capacitor)
pins: 1, 2
